# Altium footprint library SparkFun.PCBLIB: 674 footprints (part 33 of 44)
Each footprint in its own frame and in the unit in brackets; x right, y up, seen from the top. Pads: shape width x height; smd on the part's side, far side on the other; paste and mask are expansions set on the pad; w line width, h text height; cw(c..) or ccw(c..) is an arc to the next point about the centre after c.
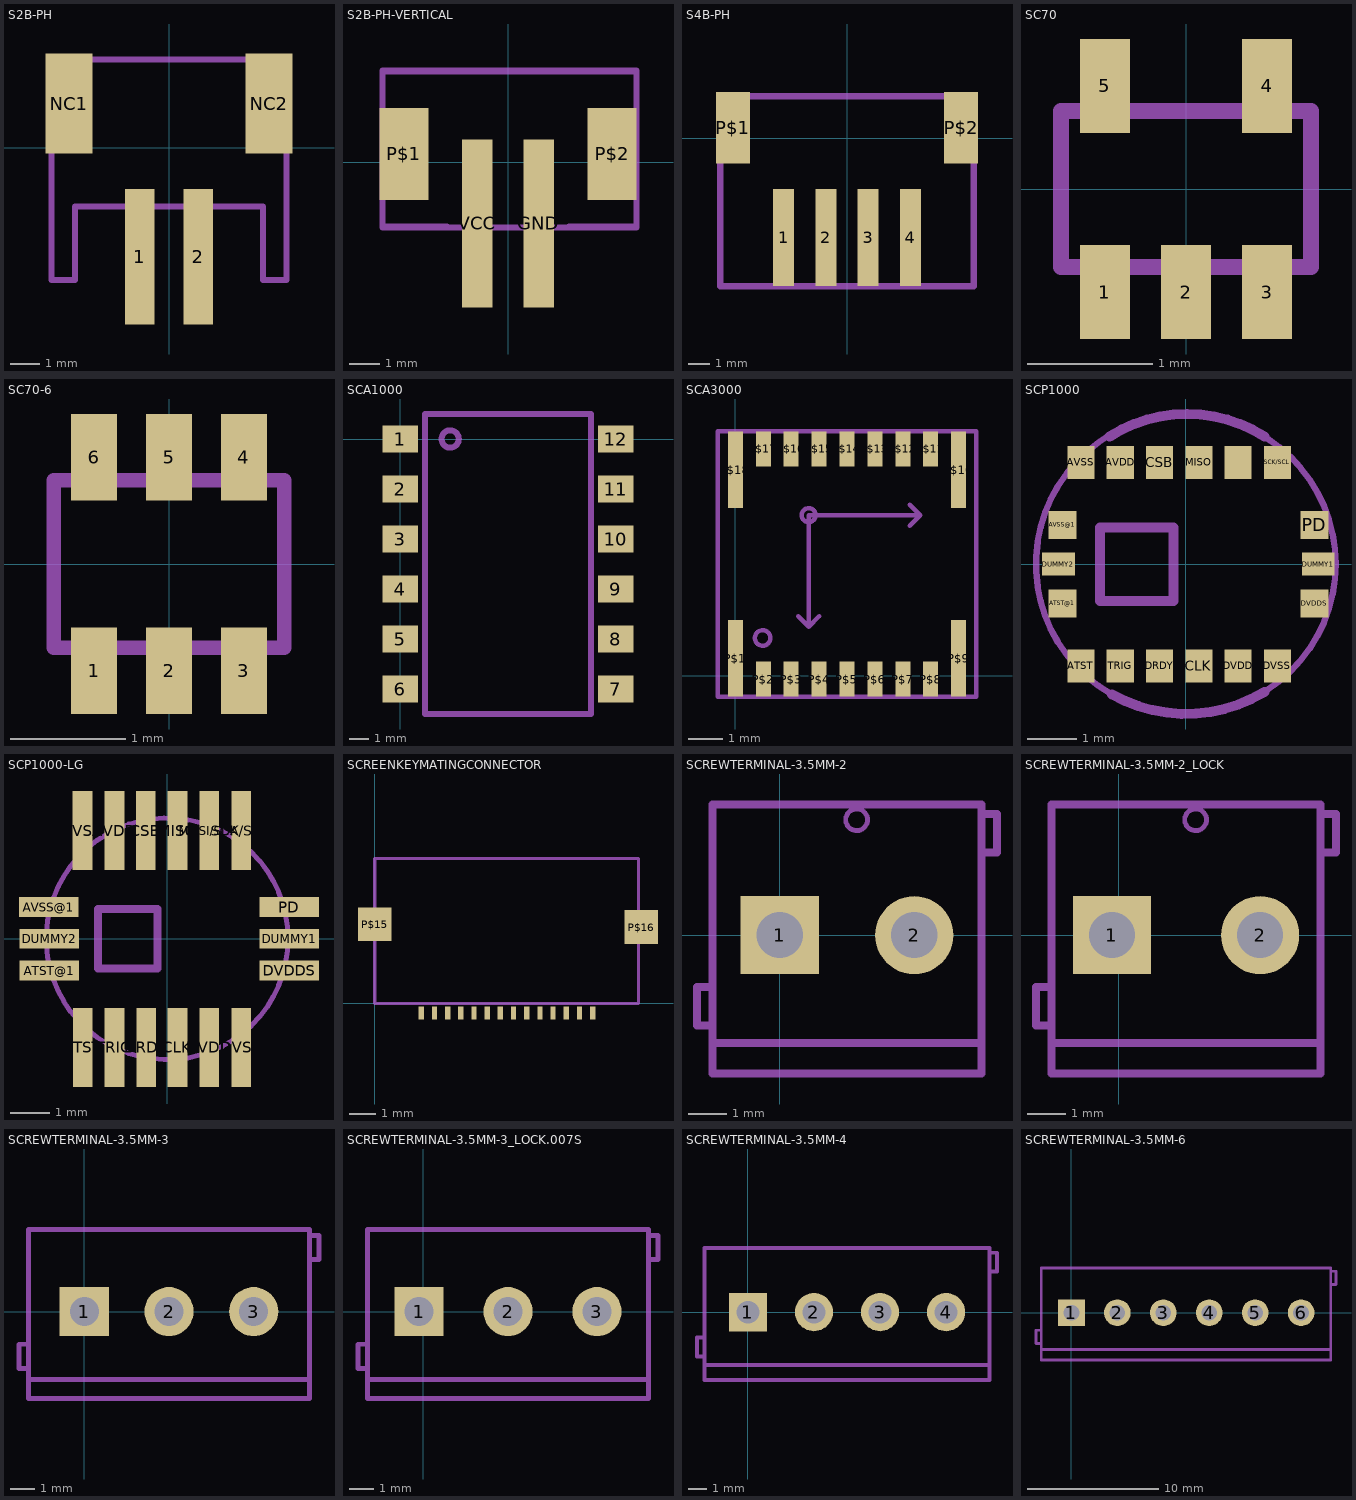
[diagram p32: the footprints below, top view; thin cyan lines are the x and y axes]

## S2B-PH [mm]
pads (4):
  rect 1x4.6 smd: 1(-1,-3.7) 2(1,-3.7)
  rect 1.6x3.4 smd: NC1(-3.4,1.5) NC2(3.4,1.5)
Mechanical 18:
  lines w0.203: -4,-4.5 -4,3 4,3 4,-4.5 3.2,-4.5 3.2,-2 -3.2,-2 -3.2,-4.5 -4,-4.5

## S2B-PH-VERTICAL [mm]
pads (4):
  rect 1x5.5 smd: GND(1,-2) VCC(-1,-2)
  rect 1.6x3 smd: P$1(-3.4,0.27) P$2(3.4,0.27)
Mechanical 2:
  lines w0.203: -4.1,-1.8 -4.1,-2.1 -2,-2.1 ; -4.1,2.3 -4.1,3 4.2,3 4.2,2.3 ; 2,-2.1 4.2,-2.1 4.2,-1.7
Mechanical 18:
  lines w0.203: -4.1,-2.13 4.2,-2.13 4.2,2.97 -4.1,2.97 -4.1,-2.13

## S4B-PH [mm]
pads (6):
  rect 1x4.6 smd: 1(-3,-4.7) 2(-1,-4.7) 3(1,-4.7) 4(3,-4.7)
  rect 1.6x3.4 smd: P$1(-5.4,0.5) P$2(5.4,0.5)
Mechanical 18:
  lines w0.305: -6,-7 -6,2 6,2 6,-7 -6,-7

## SC70 [mm]
pads (5):
  rect 0.4x0.75 smd paste-0.375: 1(-0.65,-0.825) 2(0,-0.825) 3(0.65,-0.825) 4(0.65,0.825) 5(-0.65,0.825)
Top Paste:
  rectangle: -0.85,0.45 -0.45,1.2
  rectangle: 0.45,0.45 0.85,1.2
  rectangle: -0.838,-1.168 -0.508,-0.483
  rectangle: -0.165,-1.168 0.165,-0.483
  rectangle: 0.508,-1.168 0.838,-0.483
Mechanical 18:
  lines w0.127: -1,-0.625 -1,0.625 1,0.625 1,-0.625 -1,-0.625

## SC70-6 [mm]
pads (6):
  rect 0.4x0.75 smd paste-0.375: 1(-0.65,-0.925) 2(0,-0.925) 3(0.65,-0.925) 4(0.65,0.925) 5(0,0.925) 6(-0.65,0.925)
Top Paste:
  rectangle: -0.85,0.55 -0.45,1.3
  rectangle: 0.45,0.55 0.85,1.3
  rectangle: -0.85,-1.3 -0.45,-0.55
  rectangle: -0.2,0.55 0.2,1.3
  rectangle: -0.85,-1.3 -0.45,-0.55
  rectangle: -0.85,-1.3 -0.45,-0.55
  rectangle: -0.201,-1.3 0.199,-0.55
  rectangle: 0.45,-1.3 0.85,-0.55
Mechanical 18:
  lines w0.127: -1,-0.725 -1,0.725 1,0.725 1,-0.725 -1,-0.725

## SCA1000 [mm]
pads (12):
  rect 1.81x1.39 smd: 1(0,0) 2(0,-2.54) 3(0,-5.08) 4(0,-7.62) 5(0,-10.16) 6(0,-12.7) 7(10.96,-12.7) 8(10.96,-10.16) 9(10.96,-7.62) 10(10.96,-5.08) 11(10.96,-2.54) 12(10.96,0)
Mechanical 2:
  circle w0.305: c2.54,0 r0.439
  lines w0.305: 1.27,-13.97 1.27,1.27 9.684,1.27 9.684,-13.97 1.27,-13.97

## SCA3000 [mm]
pads (18):
  rect 0.43x2.2 smd: P$1(0,0.5) P$9(6.4,0.5) P$10(6.4,5.9) P$18(0,5.9)
  rect 0.43x1 smd: P$2(0.8,-0.1) P$3(1.6,-0.1) P$4(2.4,-0.1) P$5(3.2,-0.1) P$6(4,-0.1) P$7(4.8,-0.1) P$8(5.6,-0.1) P$11(5.6,6.5) P$12(4.8,6.5) P$13(4,6.5) P$14(3.2,6.5) P$15(2.4,6.5) P$16(1.6,6.5) P$17(0.8,6.5)
Mechanical 2:
  circle w0.127: c0.78,1.08 r0.224
  lines w0.127: -0.3,-0.6 -0.5,-0.6 -0.5,7 -0.3,7 ; 6.7,-0.6 6.9,-0.6 6.9,7 6.7,7
Mechanical 18:
  circle w0.127: c2.1,4.6 r0.2
  lines w0.127: 1.8,1.7 2.1,1.4 ; 2.4,1.7 2.1,1.4 ; 5,4.3 5.3,4.6 ; 5,4.9 5.3,4.6 ; 2.1,1.4 2.1,4.6 5.3,4.6 ; -0.5,-0.6 6.9,-0.6 6.9,7 -0.5,7 -0.5,-0.6

## SCP1000 [mil]
pads (18):
  rect 21.65x26.38 smd: ATST(-84.06,-81.5) AVDD(-52.56,81.5) AVSS(-84.06,81.5) CLK(10.43,-81.5) CSB(-21.06,81.5) DRDY(-21.06,-81.5) DVDD(41.93,-81.5) DVSS(73.43,-81.5) MISO(10.43,81.5) MOSI/SDA(41.93,81.5) SCK/SCL(73.43,81.5) TRIG(-52.56,-81.5)
  rect 22.44x22.44 smd: ATST@1(-99.02,-31.5) AVSS@1(-99.02,31.5) DVDDS(102.95,-31.5) PD(102.95,31.5)
  rect 26.38x18.5 smd: DUMMY1(106.1,0) DUMMY2(-102.17,0)
Mechanical 2:
  lines w8: -61.02,102.36 cw(c0.98,4.1) 62.99,102.36 ; -59.06,-104.33 ccw(c0.3,0) 62.99,-102.36 ; -68.9,-29.53 -9.84,-29.53 -9.84,29.53 -68.9,29.53 -68.9,-29.53
Mechanical 18:
  circle w5: c0,0 r120.08

## SCP1000-LG [mm]
pads (18):
  rect 0.5x2 smd: ATST(-2.13,-2.74) AVDD(-1.33,2.73) AVSS(-2.14,2.73) CLK(0.26,-2.74) CSB(-0.54,2.73) DRDY(-0.53,-2.74) DVDD(1.06,-2.74) DVSS(1.87,-2.74) MISO(0.26,2.73) MOSI/SDA(1.06,2.73) SCK/SCL(1.87,2.73) TRIG(-1.33,-2.74)
  rect 1.5x0.5 smd: ATST@1(-2.98,-0.8) AVSS@1(-2.99,0.8) DUMMY1(3.08,0) DUMMY2(-2.98,0) DVDDS(3.08,-0.8) PD(3.08,0.8)
Mechanical 2:
  lines w0.203: -1.75,-0.75 -0.25,-0.75 -0.25,0.75 -1.75,0.75 -1.75,-0.75
Mechanical 18:
  circle w0.127: c0,0 r3.05

## SCREENKEYMATINGCONNECTOR [mm]
pads (16):
  rect 0.2x0.5 smd: 1(1.76,-0.36) 2(2.26,-0.36) 3(2.76,-0.36) 4(3.26,-0.36) 5(3.76,-0.36) 6(4.26,-0.36) 7(4.76,-0.36) 8(5.26,-0.36) 9(5.76,-0.36) 10(6.26,-0.36) 11(6.76,-0.36) 12(7.26,-0.36) 13(7.76,-0.36) 14(8.26,-0.36)
  rect 1.28x1.28 smd: P$15(0,3) P$16(10.1,2.9)
Mechanical 1:
  lines w0.127: 0,0 10,0 10,5.5 0,5.5 0,0

## SCREWTERMINAL-3.5MM-2 [mil]
pads (2):
  rect 80x80 hole 47.24: 1(0,0)
  round 80 hole 47.24: 2(137.8,0)
Mechanical 2:
  lines w8: -68.9,-110.24 -68.9,-141.73 206.69,-141.73 206.69,-110.24 ; -68.9,-110.24 -68.9,133.86 206.69,133.86 206.69,-110.24 ; -68.9,-110.24 206.69,-110.24
Mechanical 18:
  circle w5: c78.74,118.11 r11.13
  lines w8: -68.9,-92.52 -84.65,-92.52 -84.65,-53.15 -68.9,-53.15 ; 206.69,84.65 222.44,84.65 222.44,124.02 206.69,124.02

## SCREWTERMINAL-3.5MM-2_LOCK [mil]
pads (2):
  rect 80x80 hole 47.24: 1(-7,0)
  round 80 hole 47.24: 2(144.8,0)
Mechanical 2:
  lines w8: -68.9,-110.24 -68.9,-141.73 206.69,-141.73 206.69,-110.24 ; -68.9,-110.24 -68.9,133.86 206.69,133.86 206.69,-110.24 ; -68.9,-110.24 206.69,-110.24
Mechanical 18:
  circle w5: c78.74,118.11 r11.13
  circle w1: c0,0 r17
  circle w1: c137.8,0 r17
  lines w8: -68.9,-92.52 -84.65,-92.52 -84.65,-53.15 -68.9,-53.15 ; 206.69,84.65 222.44,84.65 222.44,124.02 206.69,124.02

## SCREWTERMINAL-3.5MM-3 [mil]
pads (3):
  rect 80x80 hole 47.24: 1(0,0)
  round 80 hole 47.24: 2(137.8,0) 3(275.59,0)
Mechanical 2:
  lines w8: -90.55,-110.24 -90.55,-141.73 366.14,-141.73 366.14,-110.24 ; -90.55,-110.24 -90.55,133.86 366.14,133.86 366.14,-110.24 ; -90.55,-110.24 366.14,-110.24
Mechanical 18:
  lines w8: -90.55,-92.52 -106.3,-92.52 -106.3,-53.15 -90.55,-53.15 ; 366.14,84.65 381.89,84.65 381.89,124.02 366.14,124.02

## SCREWTERMINAL-3.5MM-3_LOCK.007S [mil]
pads (3):
  rect 80x80 hole 47.24: 1(-7,0)
  round 80 hole 47.24: 2(137.8,0) 3(282.59,0)
Mechanical 2:
  lines w8: -90.55,-110.24 -90.55,-141.73 366.14,-141.73 366.14,-110.24 ; -90.55,-110.24 -90.55,133.86 366.14,133.86 366.14,-110.24 ; -90.55,-110.24 366.14,-110.24
Mechanical 18:
  circle w0.04: c0,0 r16.73
  circle w0.04: c137.8,0 r16.73
  circle w0.04: c275.59,0 r16.73
  lines w8: -90.55,-92.52 -106.3,-92.52 -106.3,-53.15 -90.55,-53.15 ; 366.14,84.65 381.89,84.65 381.89,124.02 366.14,124.02

## SCREWTERMINAL-3.5MM-4 [mil]
pads (4):
  rect 80x80 hole 47.24: 1(0,0)
  round 80 hole 47.24: 2(137.8,0) 3(275.59,0) 4(413.39,0)
Mechanical 2:
  lines w8: -90.55,-110.24 -90.55,-141.73 503.94,-141.73 503.94,-110.24 ; -90.55,-110.24 -90.55,133.86 503.94,133.86 503.94,-110.24 ; -90.55,-110.24 503.94,-110.24
Mechanical 18:
  lines w8: -90.55,-92.52 -106.3,-92.52 -106.3,-53.15 -90.55,-53.15 ; 503.94,84.65 519.69,84.65 519.69,124.02 503.94,124.02

## SCREWTERMINAL-3.5MM-6 [mil]
pads (6):
  rect 80x80 hole 47.24: 1(0,0)
  round 80 hole 47.24: 2(137.8,0) 3(275.59,0) 4(413.39,0) 5(551.18,0) 6(688.98,0)
Mechanical 2:
  lines w8: -90.55,-110.24 -90.55,-141.73 777.95,-141.73 777.95,-110.24 ; -90.55,-110.24 -90.55,133.86 777.95,133.86 777.95,-110.24 ; -90.55,-110.24 777.95,-110.24
Mechanical 18:
  lines w8: -90.55,-92.52 -106.3,-92.52 -106.3,-53.15 -90.55,-53.15 ; 777.95,84.65 793.7,84.65 793.7,124.02 777.95,124.02